# Altium footprint library ICs And Semiconductors SMD.PcbLib: 943 footprints (part 48 of 60)
Each footprint in its own frame and in the unit in brackets; x right, y up, seen from the top. Pads: shape width x height; smd on the part's side, far side on the other; paste and mask are expansions set on the pad; w line width, h text height; cw(c..) or ccw(c..) is an arc to the next point about the centre after c.
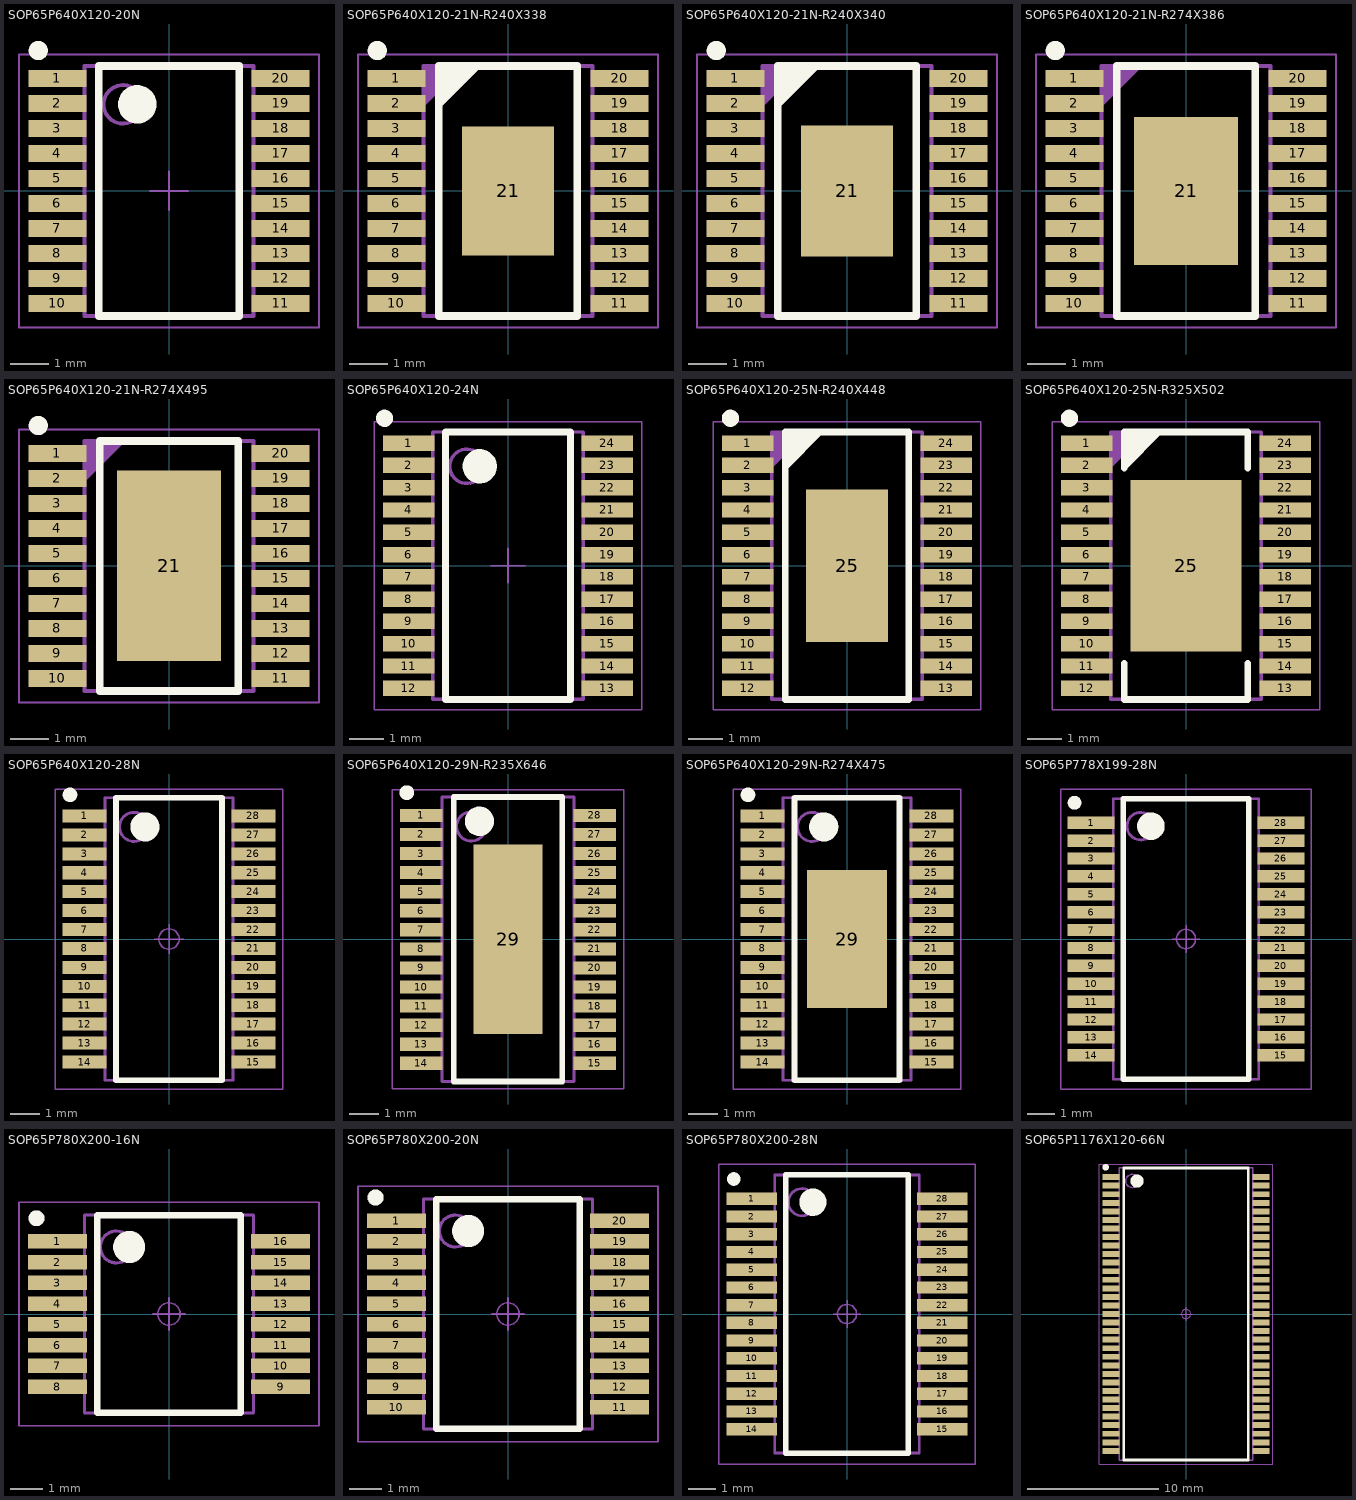
[diagram p47: the footprints below, top view; thin cyan lines are the x and y axes]

## SOP65P640X120-20N [mm] "SOP, 20-Leads, Body 6.5x4.4mm, Pitch 0.65mm, IPC Medium Density"
height 1.2
pads (20):
  rect 1.5x0.45 smd: 1(-2.9,2.925) 2(-2.9,2.275) 3(-2.9,1.625) 4(-2.9,0.975) 5(-2.9,0.325) 6(-2.9,-0.325) 7(-2.9,-0.975) 8(-2.9,-1.625) 9(-2.9,-2.275) 10(-2.9,-2.925) 11(2.9,-2.925) 12(2.9,-2.275) 13(2.9,-1.625) 14(2.9,-0.975) 15(2.9,-0.325) 16(2.9,0.325) 17(2.9,0.975) 18(2.9,1.625) 19(2.9,2.275) 20(2.9,2.925)
Top Overlay:
  circle w0.5: c-0.825,2.25 r0.25
  circle w0.25: c-3.4,3.65 r0.125
  lines w0.2: -1.825,-3.25 1.825,-3.25 1.825,3.25 -1.825,3.25 -1.825,-3.25
Mechanical 14:
  circle w0.1: c-1.2,2.25 r0.5
  lines w0.1: -2.2,-3.25 2.2,-3.25 2.2,3.25 -2.2,3.25 -2.2,-3.25
Mechanical 15:
  lines w0.05: -0.5,0 0.5,0 ; 0,-0.5 0,0.5 ; -3.9,-3.55 3.9,-3.55 3.9,3.55 -3.9,3.55 -3.9,-3.55
3D body "SOP65P640X120-20N.stp": height 1.2, standoff 0, extent -3.121,-3.3 3.121,3.3

## SOP65P640X120-21N-R240X338 [mm] "SOP, 0.65mm Pitch, 20 Pin, 4.40mm W X 6.50mm L X 1.20mm H body (w/thermal tab 2.4mm X 3.38mm), IPC Medium Density"
height 1.2
pads (21):
  rect 1.5x0.45 smd: 1(-2.9,2.925) 2(-2.9,2.275) 3(-2.9,1.625) 4(-2.9,0.975) 5(-2.9,0.325) 6(-2.9,-0.325) 7(-2.9,-0.975) 8(-2.9,-1.625) 9(-2.9,-2.275) 10(-2.9,-2.925) 11(2.9,-2.925) 12(2.9,-2.275) 13(2.9,-1.625) 14(2.9,-0.975) 15(2.9,-0.325) 16(2.9,0.325) 17(2.9,0.975) 18(2.9,1.625) 19(2.9,2.275) 20(2.9,2.925)
  rect 2.4x3.35 smd: 21(0,0)
Top Overlay:
  circle w0.25: c-3.4,3.65 r0.125
  lines w0.2: -1.8,2.25 -0.8,3.25 ; -1.8,2.45 -1,3.25 ; -1.8,2.65 -1.2,3.25 ; -1.8,2.85 -1.4,3.25 ; -1.8,3.05 -1.6,3.25 ; -1.8,-3.25 1.8,-3.25 1.8,3.25 -1.8,3.25 -1.8,-3.25
Top Paste:
  region: -0.69,-1.165 0.69,-1.165 0.69,1.165 -0.69,1.165
Mechanical 14:
  lines w0.1: -2.2,2.25 -1.2,3.25 ; -2.2,2.35 -1.3,3.25 ; -2.2,2.45 -1.4,3.25 ; -2.2,2.55 -1.5,3.25 ; -2.2,2.65 -1.6,3.25 ; -2.2,2.75 -1.7,3.25 ; -2.2,2.85 -1.8,3.25 ; -2.2,2.95 -1.9,3.25 ; -2.2,3.05 -2,3.25 ; -2.2,3.15 -2.1,3.25 ; -2.2,-3.25 2.2,-3.25 2.2,3.25 -2.2,3.25 -2.2,-3.25
Mechanical 15:
  circle w0.05: c0,0 r0.35
  lines w0.05: -0.5,0 0.5,0 ; 0,-0.5 0,0.5 ; -3.9,-3.55 3.9,-3.55 3.9,3.55 -3.9,3.55 -3.9,-3.55
3D body "SOP65P640X120-21N-R240X338.stp": height 1.2, standoff 0, extent -3.3,-3.3 3.3,3.3

## SOP65P640X120-21N-R240X340 [mm] "SOP, 0.65mm Pitch, 20 Pin, 4.40mm W X 6.50mm L X 1.20mm H body (w/thermal tab 2.4mm X 3.4mm), IPC Medium Density"
height 1.2
pads (21):
  rect 1.5x0.45 smd: 1(-2.9,2.925) 2(-2.9,2.275) 3(-2.9,1.625) 4(-2.9,0.975) 5(-2.9,0.325) 6(-2.9,-0.325) 7(-2.9,-0.975) 8(-2.9,-1.625) 9(-2.9,-2.275) 10(-2.9,-2.925) 11(2.9,-2.925) 12(2.9,-2.275) 13(2.9,-1.625) 14(2.9,-0.975) 15(2.9,-0.325) 16(2.9,0.325) 17(2.9,0.975) 18(2.9,1.625) 19(2.9,2.275) 20(2.9,2.925)
  rect 2.4x3.4 smd: 21(0,0)
Top Overlay:
  circle w0.25: c-3.4,3.65 r0.125
  lines w0.2: -1.8,2.25 -0.8,3.25 ; -1.8,2.45 -1,3.25 ; -1.8,2.65 -1.2,3.25 ; -1.8,2.85 -1.4,3.25 ; -1.8,3.05 -1.6,3.25 ; -1.8,-3.25 1.8,-3.25 1.8,3.25 -1.8,3.25 -1.8,-3.25
Top Paste:
  region: -0.69,-1.165 0.69,-1.165 0.69,1.165 -0.69,1.165
Mechanical 14:
  lines w0.1: -2.2,2.25 -1.2,3.25 ; -2.2,2.35 -1.3,3.25 ; -2.2,2.45 -1.4,3.25 ; -2.2,2.55 -1.5,3.25 ; -2.2,2.65 -1.6,3.25 ; -2.2,2.75 -1.7,3.25 ; -2.2,2.85 -1.8,3.25 ; -2.2,2.95 -1.9,3.25 ; -2.2,3.05 -2,3.25 ; -2.2,3.15 -2.1,3.25 ; -2.2,-3.25 2.2,-3.25 2.2,3.25 -2.2,3.25 -2.2,-3.25
Mechanical 15:
  circle w0.05: c0,0 r0.35
  lines w0.05: -0.5,0 0.5,0 ; 0,-0.5 0,0.5 ; -3.9,-3.55 3.9,-3.55 3.9,3.55 -3.9,3.55 -3.9,-3.55
3D body "SOP65P640X120-21N-R240X340.stp": height 1.2, standoff 0, extent -3.3,-3.3 3.3,3.3

## SOP65P640X120-21N-R274X386 [mm] "SOP, 0.65mm Pitch; 20 Pin, 4.40mm W X 6.50mm L X 1.20mm H body (w/thermal tab 2.74mm X 3.86mm  ), IPC Medium Density"
height 1.2
pads (21):
  rect 1.5x0.45 smd: 1(-2.9,2.925) 2(-2.9,2.275) 3(-2.9,1.625) 4(-2.9,0.975) 5(-2.9,0.325) 6(-2.9,-0.325) 7(-2.9,-0.975) 8(-2.9,-1.625) 9(-2.9,-2.275) 10(-2.9,-2.925) 11(2.9,-2.925) 12(2.9,-2.275) 13(2.9,-1.625) 14(2.9,-0.975) 15(2.9,-0.325) 16(2.9,0.325) 17(2.9,0.975) 18(2.9,1.625) 19(2.9,2.275) 20(2.9,2.925)
  rect 2.7x3.85 smd: 21(0,0)
Top Overlay:
  circle w0.25: c-3.4,3.65 r0.125
  lines w0.2: -1.8,-3.25 -1.8,3.25 1.8,3.25 1.8,-3.25 -1.8,-3.25
Mechanical 14:
  lines w0.1: -2.2,2.25 -1.2,3.25 ; -2.2,2.35 -1.3,3.25 ; -2.2,2.45 -1.4,3.25 ; -2.2,2.55 -1.5,3.25 ; -2.2,2.65 -1.6,3.25 ; -2.2,2.75 -1.7,3.25 ; -2.2,2.85 -1.8,3.25 ; -2.2,2.95 -1.9,3.25 ; -2.2,3.05 -2,3.25 ; -2.2,3.15 -2.1,3.25 ; -2.2,-3.25 -2.2,3.25 2.2,3.25 2.2,-3.25 -2.2,-3.25
Mechanical 15:
  circle w0.05: c0,0 r0.35
  lines w0.05: -0.5,0 0.5,0 ; 0,-0.5 0,0.5 ; -3.9,-3.55 -3.9,3.55 3.9,3.55 3.9,-3.55 -3.9,-3.55
3D body "SOP65P640X120-21N-R274X386.stp": height 1.2, standoff 0, extent -3.3,-3.3 3.3,3.3

## SOP65P640X120-21N-R274X495 [mm] "SOP,0.65mm,pitch;20 pin,4.40mm W X 6.50mm L X 1.20mm H body (w/thermal tab 2.74mm X 4.95mm  ), IPC Medium Density"
height 1.2
pads (21):
  rect 1.5x0.45 smd: 1(-2.9,2.925) 2(-2.9,2.275) 3(-2.9,1.625) 4(-2.9,0.975) 5(-2.9,0.325) 6(-2.9,-0.325) 7(-2.9,-0.975) 8(-2.9,-1.625) 9(-2.9,-2.275) 10(-2.9,-2.925) 11(2.9,-2.925) 12(2.9,-2.275) 13(2.9,-1.625) 14(2.9,-0.975) 15(2.9,-0.325) 16(2.9,0.325) 17(2.9,0.975) 18(2.9,1.625) 19(2.9,2.275) 20(2.9,2.925)
  rect 2.7x4.95 smd: 21(0,0)
Top Overlay:
  circle w0.25: c-3.4,3.65 r0.125
  lines w0.2: -1.8,-3.25 1.8,-3.25 1.8,3.25 -1.8,3.25 -1.8,-3.25
Top Paste:
  region: -0.72,-2.05 0.72,-2.05 0.72,-0.21 -0.72,-0.21
  region: -0.72,0.21 0.72,0.21 0.72,2.05 -0.72,2.05
Mechanical 14:
  lines w0.1: -2.2,2.25 -1.2,3.25 ; -2.2,2.35 -1.3,3.25 ; -2.2,2.45 -1.4,3.25 ; -2.2,2.55 -1.5,3.25 ; -2.2,2.65 -1.6,3.25 ; -2.2,2.75 -1.7,3.25 ; -2.2,2.85 -1.8,3.25 ; -2.2,2.95 -1.9,3.25 ; -2.2,3.05 -2,3.25 ; -2.2,3.15 -2.1,3.25 ; -2.2,-3.25 2.2,-3.25 2.2,3.25 -2.2,3.25 -2.2,-3.25
Mechanical 15:
  circle w0.05: c0,0 r0.35
  lines w0.05: -0.5,0 0.5,0 ; 0,-0.5 0,0.5 ; -3.9,-3.55 3.9,-3.55 3.9,3.55 -3.9,3.55 -3.9,-3.55
3D body "SOP65P640X120-21N-R274X495.stp": height 1.2, standoff 0, extent -3.121,-3.3 3.121,3.3

## SOP65P640X120-24N [mm] "SOP, 0.65mm Pitch; 24 Pin, 4.40mm W X 7.80mm L X 1.20mm H Body, IPC Medium Density"
height 1.2
pads (24):
  rect 1.5x0.45 smd: 1(-2.9,3.575) 2(-2.9,2.925) 3(-2.9,2.275) 4(-2.9,1.625) 5(-2.9,0.975) 6(-2.9,0.325) 7(-2.9,-0.325) 8(-2.9,-0.975) 9(-2.9,-1.625) 10(-2.9,-2.275) 11(-2.9,-2.925) 12(-2.9,-3.575) 13(2.9,-3.575) 14(2.9,-2.925) 15(2.9,-2.275) 16(2.9,-1.625) 17(2.9,-0.975) 18(2.9,-0.325) 19(2.9,0.325) 20(2.9,0.975) 21(2.9,1.625) 22(2.9,2.275) 23(2.9,2.925) 24(2.9,3.575)
Top Overlay:
  circle w0.25: c-3.6,4.3 r0.125
  circle w0.5: c-0.825,2.9 r0.25
  lines w0.2: -1.825,-3.9 -1.825,3.9 1.825,3.9 1.825,-3.9 -1.825,-3.9
Mechanical 14:
  circle w0.1: c-1.2,2.9 r0.5
  lines w0.1: -2.2,-3.9 2.2,-3.9 2.2,3.9 -2.2,3.9 -2.2,-3.9
Mechanical 15:
  lines w0.05: -0.5,0 0.5,0 ; 0,-0.5 0,0.5 ; -3.9,-4.2 3.9,-4.2 3.9,4.2 -3.9,4.2 -3.9,-4.2
3D body "SOP65P640X120-24N.stp": height 1.2, standoff 0, extent -3.121,-3.95 3.121,3.95

## SOP65P640X120-25N-R240X448 [mm] "SOP, 0.65mm, pitch; 24 pin , 4.40mm W X 7.80mm L X 1.20mm H body (w/thermal tab), IPC Medium Density"
height 1.2
pads (25):
  rect 1.5x0.45 smd: 1(-2.9,3.575) 2(-2.9,2.925) 3(-2.9,2.275) 4(-2.9,1.625) 5(-2.9,0.975) 6(-2.9,0.325) 7(-2.9,-0.325) 8(-2.9,-0.975) 9(-2.9,-1.625) 10(-2.9,-2.275) 11(-2.9,-2.925) 12(-2.9,-3.575) 13(2.9,-3.575) 14(2.9,-2.925) 15(2.9,-2.275) 16(2.9,-1.625) 17(2.9,-0.975) 18(2.9,-0.325) 19(2.9,0.325) 20(2.9,0.975) 21(2.9,1.625) 22(2.9,2.275) 23(2.9,2.925) 24(2.9,3.575)
  rect 2.4x4.45 smd: 25(0,0)
Top Overlay:
  circle w0.25: c-3.4,4.3 r0.125
  lines w0.2: -1.8,2.9 -0.8,3.9 ; -1.8,3.1 -1,3.9 ; -1.8,3.3 -1.2,3.9 ; -1.8,3.5 -1.4,3.9 ; -1.8,3.7 -1.6,3.9 ; -1.8,-3.9 1.8,-3.9 1.8,3.9 -1.8,3.9 -1.8,-3.9
Mechanical 14:
  lines w0.1: -2.2,2.9 -1.2,3.9 ; -2.2,3 -1.3,3.9 ; -2.2,3.1 -1.4,3.9 ; -2.2,3.2 -1.5,3.9 ; -2.2,3.3 -1.6,3.9 ; -2.2,3.4 -1.7,3.9 ; -2.2,3.5 -1.8,3.9 ; -2.2,3.6 -1.9,3.9 ; -2.2,3.7 -2,3.9 ; -2.2,3.8 -2.1,3.9 ; -2.2,-3.9 2.2,-3.9 2.2,3.9 -2.2,3.9 -2.2,-3.9
Mechanical 15:
  circle w0.05: c0,0 r0.35
  lines w0.05: -0.5,0 0.5,0 ; 0,-0.5 0,0.5 ; -3.9,-4.2 3.9,-4.2 3.9,4.2 -3.9,4.2 -3.9,-4.2
3D body "SOP65P640X120-25N-R240X448.stp": height 1.2, standoff 0, extent -3.121,-3.95 3.121,3.95

## SOP65P640X120-25N-R325X502 [mm] "SOP, 0.65mm, Pitch; 24 Pin , 4.40mm W X 7.80mm L X 1.20mm H Body (w/Thermal tab 3.25x5.02mm), IPC Medium Density"
height 1.2
pads (25):
  rect 1.5x0.45 smd: 1(-2.9,3.575) 2(-2.9,2.925) 3(-2.9,2.275) 4(-2.9,1.625) 5(-2.9,0.975) 6(-2.9,0.325) 7(-2.9,-0.325) 8(-2.9,-0.975) 9(-2.9,-1.625) 10(-2.9,-2.275) 11(-2.9,-2.925) 12(-2.9,-3.575) 13(2.9,-3.575) 14(2.9,-2.925) 15(2.9,-2.275) 16(2.9,-1.625) 17(2.9,-0.975) 18(2.9,-0.325) 19(2.9,0.325) 20(2.9,0.975) 21(2.9,1.625) 22(2.9,2.275) 23(2.9,2.925) 24(2.9,3.575)
  rect 3.25x5 smd: 25(0,0)
Top Overlay:
  circle w0.25: c-3.4,4.3 r0.125
  lines w0.2: -1.8,-2.85 -1.8,-3.9 1.8,-3.9 1.8,-2.85 ; -1.8,2.85 -1.8,3.9 1.8,3.9 1.8,2.85 ; -1.8,2.9 -0.8,3.9 ; -1.8,3.1 -1,3.9 ; -1.8,3.3 -1.2,3.9 ; -1.8,3.5 -1.4,3.9 ; -1.8,3.7 -1.6,3.9
Top Paste:
  region: -0.91,0.24 0.91,0.24 0.91,2.02 -0.91,2.02
  region: -0.91,-2.02 0.91,-2.02 0.91,-0.24 -0.91,-0.24
Mechanical 14:
  lines w0.1: -2.2,2.9 -1.2,3.9 ; -2.2,3 -1.3,3.9 ; -2.2,3.1 -1.4,3.9 ; -2.2,3.2 -1.5,3.9 ; -2.2,3.3 -1.6,3.9 ; -2.2,3.4 -1.7,3.9 ; -2.2,3.5 -1.8,3.9 ; -2.2,3.6 -1.9,3.9 ; -2.2,3.7 -2,3.9 ; -2.2,3.8 -2.1,3.9 ; -2.2,-3.9 -2.2,3.9 2.2,3.9 2.2,-3.9 -2.2,-3.9
Mechanical 15:
  circle w0.05: c0,0 r0.35
  lines w0.05: -0.5,0 0.5,0 ; 0,-0.5 0,0.5 ; -3.9,-4.2 -3.9,4.2 3.9,4.2 3.9,-4.2 -3.9,-4.2
3D body "SOP65P640X120-25N-R325X502.stp": height 1.2, standoff 0, extent -3.121,-3.95 3.121,3.95

## SOP65P640X120-28N [mm] "SOP, 0.65mm Pitch; 28 Pin, 4.40mm W X 9.70mm L X 1.20mm H body, IPC Medium Density"
height 1.2
pads (28):
  rect 1.5x0.45 smd: 1(-2.9,4.225) 2(-2.9,3.575) 3(-2.9,2.925) 4(-2.9,2.275) 5(-2.9,1.625) 6(-2.9,0.975) 7(-2.9,0.325) 8(-2.9,-0.325) 9(-2.9,-0.975) 10(-2.9,-1.625) 11(-2.9,-2.275) 12(-2.9,-2.925) 13(-2.9,-3.575) 14(-2.9,-4.225) 15(2.9,-4.225) 16(2.9,-3.575) 17(2.9,-2.925) 18(2.9,-2.275) 19(2.9,-1.625) 20(2.9,-0.975) 21(2.9,-0.325) 22(2.9,0.325) 23(2.9,0.975) 24(2.9,1.625) 25(2.9,2.275) 26(2.9,2.925) 27(2.9,3.575) 28(2.9,4.225)
Top Overlay:
  circle w0.5: c-0.825,3.85 r0.25
  circle w0.25: c-3.4,4.95 r0.125
  lines w0.2: -1.825,-4.85 1.825,-4.85 1.825,4.85 -1.825,4.85 -1.825,-4.85
Mechanical 14:
  circle w0.1: c-1.2,3.85 r0.5
  lines w0.1: -2.2,-4.85 2.2,-4.85 2.2,4.85 -2.2,4.85 -2.2,-4.85
Mechanical 15:
  circle w0.05: c0,0 r0.35
  lines w0.05: -0.5,0 0.5,0 ; 0,-0.5 0,0.5 ; -3.9,-5.15 3.9,-5.15 3.9,5.15 -3.9,5.15 -3.9,-5.15
3D body "SOP65P640X120-28N.stp": height 1.2, standoff 0, extent -3.121,-4.9 3.121,4.9

## SOP65P640X120-29N-R235X646 [mm] "SOP, 0.65mm pitch; 28 pin, 4.50mm W X 9.70mm L (thermal tab 6.46 X 2.35mm), IPC Medium Density"
height 1.2
pads (29):
  rect 1.45x0.45 smd: 1(-2.95,4.225) 2(-2.95,3.575) 3(-2.95,2.925) 4(-2.95,2.275) 5(-2.95,1.625) 6(-2.95,0.975) 7(-2.95,0.325) 8(-2.95,-0.325) 9(-2.95,-0.975) 10(-2.95,-1.625) 11(-2.95,-2.275) 12(-2.95,-2.925) 13(-2.95,-3.575) 14(-2.95,-4.225) 15(2.95,-4.225) 16(2.95,-3.575) 17(2.95,-2.925) 18(2.95,-2.275) 19(2.95,-1.625) 20(2.95,-0.975) 21(2.95,-0.325) 22(2.95,0.325) 23(2.95,0.975) 24(2.95,1.625) 25(2.95,2.275) 26(2.95,2.925) 27(2.95,3.575) 28(2.95,4.225)
  rect 2.35x6.46 smd: 29(0,0)
Top Overlay:
  circle w0.5: c-0.975,4.025 r0.25
  circle w0.25: c-3.45,5 r0.125
  lines w0.2: -1.85,-4.85 -1.85,4.85 1.85,4.85 1.85,-4.85 -1.85,-4.85
Top Paste:
  region: -0.705,-0.65 0.705,-0.65 0.705,-2.59 -0.705,-2.59
  region: -0.705,2.58 0.705,2.58 0.705,0.64 -0.705,0.64
Mechanical 14:
  circle w0.1: c-1.25,3.85 r0.5
  lines w0.1: -2.25,-4.85 -2.25,4.85 2.25,4.85 2.25,-4.85 -2.25,-4.85
Mechanical 15:
  lines w0.05: -0.5,0 0.5,0 ; 0,-0.5 0,0.5 ; -3.95,-5.1 -3.95,5.1 3.95,5.1 3.95,-5.1 -3.95,-5.1
3D body "SOP65P640X120-29N-R235X646.stp": height 1.2, standoff 0, extent -3.221,-4.9 3.221,4.9

## SOP65P640X120-29N-R274X475 [mm] "SOP, 0.65mm pitch; 28 pin, 4.50mm W X 9.70mm L (thermal tab 4.75 X 2.74mm), IPC Medium Density"
height 1.2
pads (29):
  rect 1.5x0.45 smd: 1(-2.9,4.225) 2(-2.9,3.575) 3(-2.9,2.925) 4(-2.9,2.275) 5(-2.9,1.625) 6(-2.9,0.975) 7(-2.9,0.325) 8(-2.9,-0.325) 9(-2.9,-0.975) 10(-2.9,-1.625) 11(-2.9,-2.275) 12(-2.9,-2.925) 13(-2.9,-3.575) 14(-2.9,-4.225) 15(2.9,-4.225) 16(2.9,-3.575) 17(2.9,-2.925) 18(2.9,-2.275) 19(2.9,-1.625) 20(2.9,-0.975) 21(2.9,-0.325) 22(2.9,0.325) 23(2.9,0.975) 24(2.9,1.625) 25(2.9,2.275) 26(2.9,2.925) 27(2.9,3.575) 28(2.9,4.225)
  rect 2.74x4.75 smd paste-0.62: 29(0,0)
Top Overlay:
  circle w0.25: c-3.4,4.95 r0.125
  circle w0.5: c-0.8,3.85 r0.25
  lines w0.2: -1.8,-4.85 -1.8,4.85 1.8,4.85 1.8,-4.85 -1.8,-4.85
Mechanical 14:
  circle w0.1: c-1.2,3.85 r0.5
  lines w0.1: -2.2,-4.85 -2.2,4.85 2.2,4.85 2.2,-4.85 -2.2,-4.85
Mechanical 15:
  circle w0.05: c0,0 r0.35
  lines w0.05: -0.5,0 0.5,0 ; 0,-0.5 0,0.5 ; -3.9,-5.15 -3.9,5.15 3.9,5.15 3.9,-5.15 -3.9,-5.15
3D body "SOP65P640X120-29N-R475X274.stp": height 1.2, standoff 0, extent -3.221,-4.9 3.221,4.9

## SOP65P778X199-28N [mm] "SOP, 0.65mm Pitch; 28 Pin, 5.29mm W X 10.20mm L X 1.99mm H Body, IPC Medium Density"
height 1.99
pads (28):
  rect 1.7x0.45 smd: 1(-3.45,4.225) 2(-3.45,3.575) 3(-3.45,2.925) 4(-3.45,2.275) 5(-3.45,1.625) 6(-3.45,0.975) 7(-3.45,0.325) 8(-3.45,-0.325) 9(-3.45,-0.975) 10(-3.45,-1.625) 11(-3.45,-2.275) 12(-3.45,-2.925) 13(-3.45,-3.575) 14(-3.45,-4.225) 15(3.45,-4.225) 16(3.45,-3.575) 17(3.45,-2.925) 18(3.45,-2.275) 19(3.45,-1.625) 20(3.45,-0.975) 21(3.45,-0.325) 22(3.45,0.325) 23(3.45,0.975) 24(3.45,1.625) 25(3.45,2.275) 26(3.45,2.925) 27(3.45,3.575) 28(3.45,4.225)
Top Overlay:
  circle w0.25: c-4.05,4.95 r0.125
  circle w0.5: c-1.275,4.1 r0.25
  lines w0.2: -2.275,-5.1 -2.275,5.1 2.275,5.1 2.275,-5.1 -2.275,-5.1
Mechanical 14:
  circle w0.1: c-1.645,4.1 r0.5
  lines w0.1: -2.645,-5.1 -2.645,5.1 2.645,5.1 2.645,-5.1 -2.645,-5.1
Mechanical 15:
  circle w0.05: c0,0 r0.35
  lines w0.05: -0.5,0 0.5,0 ; 0,-0.5 0,0.5 ; -4.55,-5.45 -4.55,5.45 4.55,5.45 4.55,-5.45 -4.55,-5.45
3D body "SOP65P778X199-28N.stp": height 2, standoff 0.01, extent -3.885,-5.165 3.885,5.165

## SOP65P780X200-16N [mm] "SOP, 0.65mm Pitch; 16 Pin, 5.30mm W X 6.20mm L X 2.00mm H Body, IPC Medium Density"
height 2
pads (16):
  rect 1.85x0.45 smd: 1(-3.5,2.275) 2(-3.5,1.625) 3(-3.5,0.975) 4(-3.5,0.325) 5(-3.5,-0.325) 6(-3.5,-0.975) 7(-3.5,-1.625) 8(-3.5,-2.275) 9(3.5,-2.275) 10(3.5,-1.625) 11(3.5,-0.975) 12(3.5,-0.325) 13(3.5,0.325) 14(3.5,0.975) 15(3.5,1.625) 16(3.5,2.275)
Top Overlay:
  circle w0.5: c-1.25,2.1 r0.25
  circle w0.25: c-4.15,3 r0.125
  lines w0.2: -2.25,-3.1 2.25,-3.1 2.25,3.1 -2.25,3.1 -2.25,-3.1
Mechanical 14:
  circle w0.1: c-1.65,2.1 r0.5
  lines w0.1: -2.65,-3.1 2.65,-3.1 2.65,3.1 -2.65,3.1 -2.65,-3.1
Mechanical 15:
  circle w0.05: c0,0 r0.35
  lines w0.05: -0.5,0 0.5,0 ; 0,-0.5 0,0.5 ; -4.7,-3.5 4.7,-3.5 4.7,3.5 -4.7,3.5 -4.7,-3.5
3D body "SOP65P780X200-16N.stp": height 2, standoff 0, extent -4.114,-3.25 4.114,3.25

## SOP65P780X200-20N [mm] "SOP, 0.65mm Pitch; 20 pin, 5.30mm W X 7.20mm L X 2.00mm H body, IPC Medium Density"
height 2
pads (20):
  rect 1.85x0.45 smd: 1(-3.5,2.925) 2(-3.5,2.275) 3(-3.5,1.625) 4(-3.5,0.975) 5(-3.5,0.325) 6(-3.5,-0.325) 7(-3.5,-0.975) 8(-3.5,-1.625) 9(-3.5,-2.275) 10(-3.5,-2.925) 11(3.5,-2.925) 12(3.5,-2.275) 13(3.5,-1.625) 14(3.5,-0.975) 15(3.5,-0.325) 16(3.5,0.325) 17(3.5,0.975) 18(3.5,1.625) 19(3.5,2.275) 20(3.5,2.925)
Top Overlay:
  circle w0.25: c-4.15,3.65 r0.125
  circle w0.5: c-1.25,2.6 r0.25
  lines w0.2: -2.25,-3.6 2.25,-3.6 2.25,3.6 -2.25,3.6 -2.25,-3.6
Mechanical 14:
  circle w0.1: c-1.65,2.6 r0.5
  lines w0.1: -2.65,-3.6 2.65,-3.6 2.65,3.6 -2.65,3.6 -2.65,-3.6
Mechanical 15:
  circle w0.05: c0,0 r0.35
  lines w0.05: -0.5,0 0.5,0 ; 0,-0.5 0,0.5 ; -4.7,-4 4.7,-4 4.7,4 -4.7,4 -4.7,-4
3D body "SOP65P780X200-20N.stp": height 2, standoff 0, extent -4.114,-3.75 4.114,3.75

## SOP65P780X200-28N [mm] "SOP, 0.65mm Pitch; 28 Pin, 5.30mm W X 10.20mm L X 2.00mm H Body, IPC Medium Density"
height 2
pads (28):
  rect 1.85x0.45 smd: 1(-3.5,4.225) 2(-3.5,3.575) 3(-3.5,2.925) 4(-3.5,2.275) 5(-3.5,1.625) 6(-3.5,0.975) 7(-3.5,0.325) 8(-3.5,-0.325) 9(-3.5,-0.975) 10(-3.5,-1.625) 11(-3.5,-2.275) 12(-3.5,-2.925) 13(-3.5,-3.575) 14(-3.5,-4.225) 15(3.5,-4.225) 16(3.5,-3.575) 17(3.5,-2.925) 18(3.5,-2.275) 19(3.5,-1.625) 20(3.5,-0.975) 21(3.5,-0.325) 22(3.5,0.325) 23(3.5,0.975) 24(3.5,1.625) 25(3.5,2.275) 26(3.5,2.925) 27(3.5,3.575) 28(3.5,4.225)
Top Overlay:
  circle w0.5: c-1.25,4.1 r0.25
  circle w0.25: c-4.15,4.95 r0.125
  lines w0.2: -2.25,-5.1 2.25,-5.1 2.25,5.1 -2.25,5.1 -2.25,-5.1
Mechanical 14:
  circle w0.1: c-1.65,4.1 r0.5
  lines w0.1: -2.65,-5.1 2.65,-5.1 2.65,5.1 -2.65,5.1 -2.65,-5.1
Mechanical 15:
  circle w0.05: c0,0 r0.35
  lines w0.05: -0.5,0 0.5,0 ; 0,-0.5 0,0.5 ; -4.7,-5.5 4.7,-5.5 4.7,5.5 -4.7,5.5 -4.7,-5.5
3D body "SOP65P780X200-28N.stp": height 2, standoff 0, extent -4.114,-5.25 4.114,5.25

## SOP65P1176X120-66N [mm] "SOP, 0.65mm Pitch; 66 Pin, 10.16mm W X 22.22mm L X 1.20mm H Body, IPC Medium Density"
height 1.2
pads (66):
  rect 1.3x0.45 smd: 1(-5.7,10.4) 2(-5.7,9.75) 3(-5.7,9.1) 4(-5.7,8.45) 5(-5.7,7.8) 6(-5.7,7.15) 7(-5.7,6.5) 8(-5.7,5.85) 9(-5.7,5.2) 10(-5.7,4.55) 11(-5.7,3.9) 12(-5.7,3.25) 13(-5.7,2.6) 14(-5.7,1.95) 15(-5.7,1.3) 16(-5.7,0.65) 17(-5.7,0) 18(-5.7,-0.65) 19(-5.7,-1.3) 20(-5.7,-1.95) 21(-5.7,-2.6) 22(-5.7,-3.25) 23(-5.7,-3.9) 24(-5.7,-4.55) 25(-5.7,-5.2) 26(-5.7,-5.85) 27(-5.7,-6.5) 28(-5.7,-7.15) 29(-5.7,-7.8) 30(-5.7,-8.45) 31(-5.7,-9.1) 32(-5.7,-9.75) 33(-5.7,-10.4) 34(5.7,-10.4) 35(5.7,-9.75) 36(5.7,-9.1) 37(5.7,-8.45) 38(5.7,-7.8) 39(5.7,-7.15) 40(5.7,-6.5) 41(5.7,-5.85) 42(5.7,-5.2) 43(5.7,-4.55) 44(5.7,-3.9) 45(5.7,-3.25) 46(5.7,-2.6) 47(5.7,-1.95) 48(5.7,-1.3) 49(5.7,-0.65) 50(5.7,0) 51(5.7,0.65) 52(5.7,1.3) 53(5.7,1.95) 54(5.7,2.6) 55(5.7,3.25) 56(5.7,3.9) 57(5.7,4.55) 58(5.7,5.2) 59(5.7,5.85) 60(5.7,6.5) 61(5.7,7.15) 62(5.7,7.8) 63(5.7,8.45) 64(5.7,9.1) 65(5.7,9.75) 66(5.7,10.4)
Top Overlay:
  circle w0.5: c-3.725,10.1 r0.25
  circle w0.25: c-6.1,11.15 r0.125
  lines w0.2: -4.725,-11.1 4.725,-11.1 4.725,11.1 -4.725,11.1 -4.725,-11.1
Mechanical 14:
  circle w0.1: c-4.08,10.11 r0.5
  lines w0.1: -5.08,-11.11 5.08,-11.11 5.08,11.11 -5.08,11.11 -5.08,-11.11
Mechanical 15:
  circle w0.05: c0,0 r0.35
  lines w0.05: -0.5,0 0.5,0 ; 0,-0.5 0,0.5 ; -6.6,-11.4 6.6,-11.4 6.6,11.4 -6.6,11.4 -6.6,-11.4
3D body "SOP65P1176X120-66N.stp": height 1.2, standoff 0, extent -5.98,-11.15 5.98,11.15